# Altium footprint library Maxwell_LIB.PcbLib: 143 footprints (part 4 of 9)
Each footprint in its own frame and in the unit in brackets; x right, y up, seen from the top. Pads: shape width x height; smd on the part's side, far side on the other; paste and mask are expansions set on the pad; w line width, h text height; cw(c..) or ccw(c..) is an arc to the next point about the centre after c.
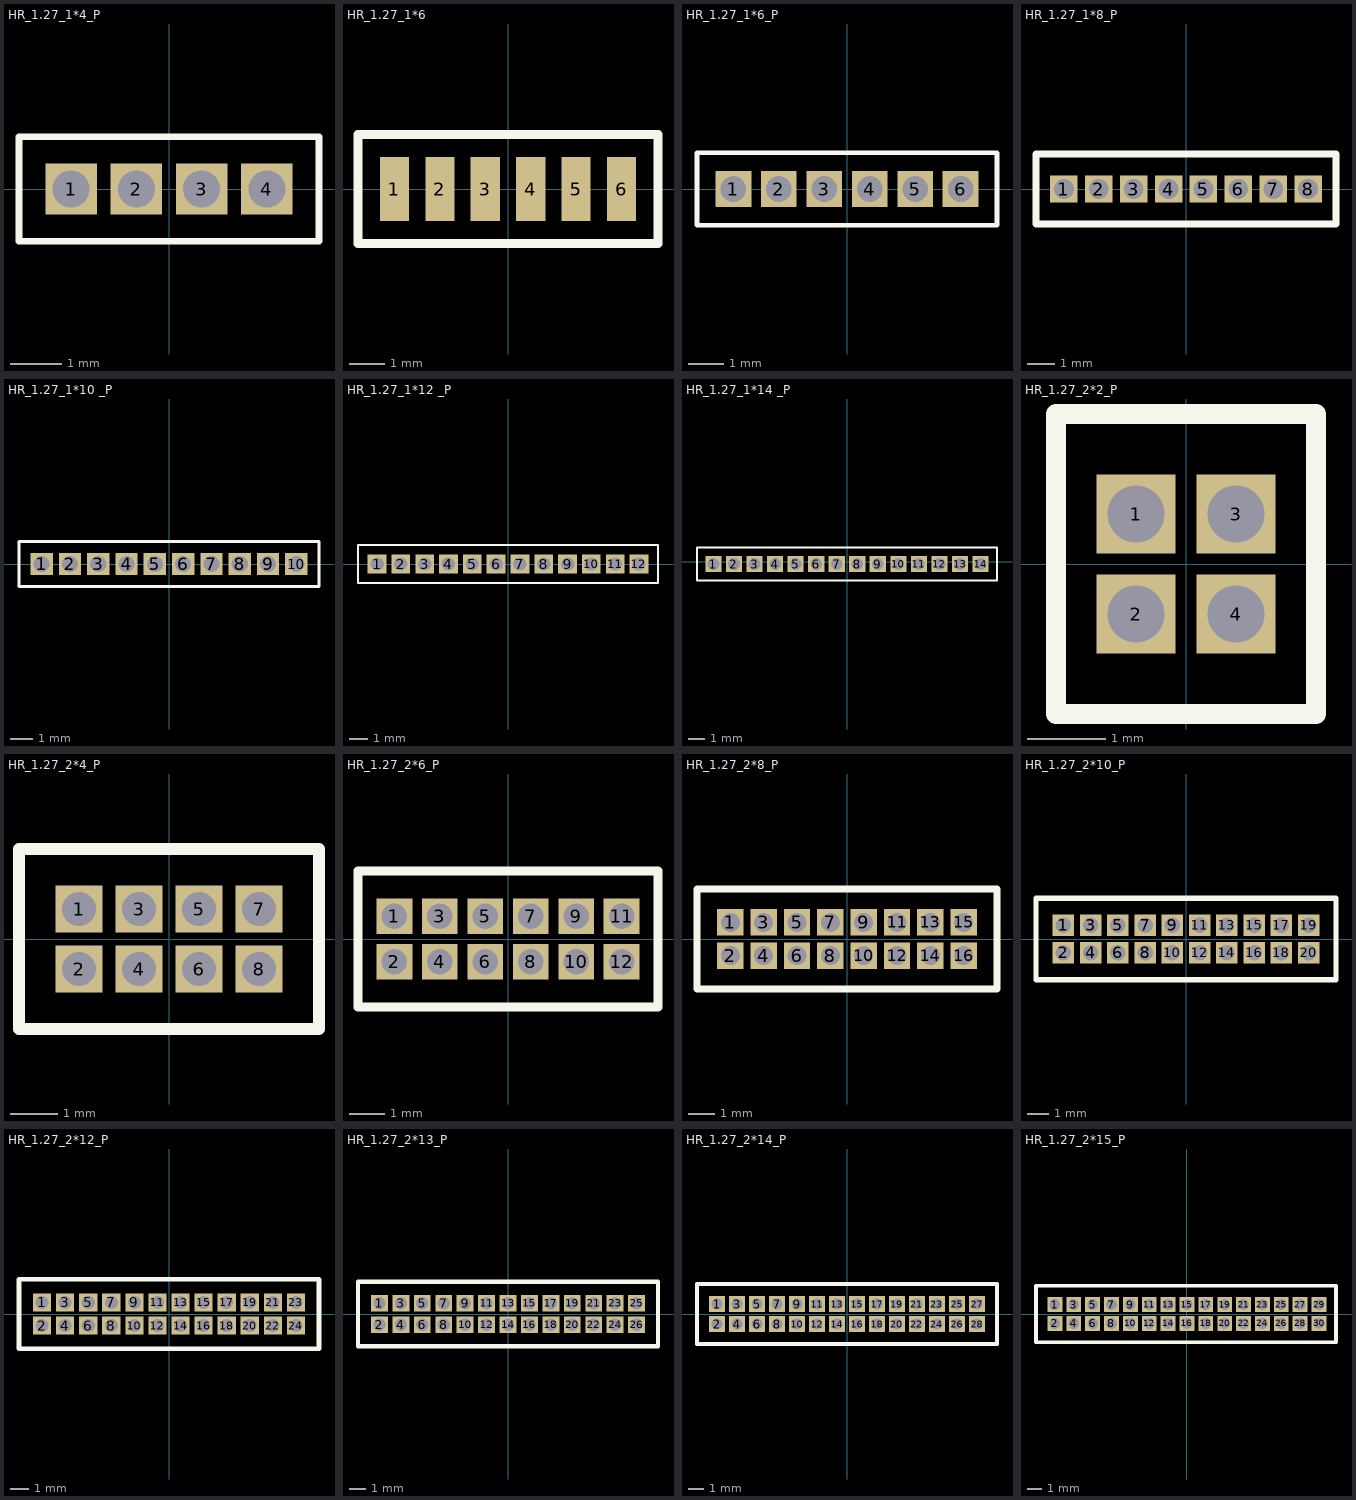
[diagram p3: the footprints below, top view; thin cyan lines are the x and y axes]

## HR_1.27_1*4_P [mm]
pads (4):
  rect 1x1 hole 0.72: 1(-1.905,0) 2(-0.635,0) 3(0.635,0) 4(1.905,0)
Top Overlay:
  lines w0.127: -2.921,-1.016 -2.921,1.016 2.921,1.016 2.921,-1.016 -2.921,-1.016

## HR_1.27_1*6 [mil]
pads (6):
  rect 32x70 smd: 1(-125,0) 2(-75,0) 3(-25,0) 4(25,0) 5(75,0) 6(125,0)
Top Overlay:
  lines w10: -165,-60 -165,60 165,60 165,-60 -165,-60

## HR_1.27_1*6_P [mm]
pads (6):
  rect 1x1 hole 0.72: 1(-3.175,0) 2(-1.905,0) 3(-0.635,0) 4(0.635,0) 5(1.905,0) 6(3.175,0)
Top Overlay:
  lines w0.127: -4.191,-1.016 1.651,-1.016 4.191,-1.016 4.191,1.016 1.651,1.016 -4.191,1.016 -4.191,-1.016

## HR_1.27_1*8_P [mm]
pads (8):
  rect 1x1 hole 0.72: 1(-4.445,0) 2(-3.175,0) 3(-1.905,0) 4(-0.635,0) 5(0.635,0) 6(1.905,0) 7(3.175,0) 8(4.445,0)
Top Overlay:
  lines w0.254: -5.461,-1.27 5.461,-1.27 5.461,1.27 -5.461,1.27 -5.461,-1.27

## HR_1.27_1*10 _P [mm]
pads (10):
  rect 1x1 hole 0.72: 1(-5.715,0) 2(-4.445,0) 3(-3.175,0) 4(-1.905,0) 5(-0.635,0) 6(0.635,0) 7(1.905,0) 8(3.175,0) 9(4.445,0) 10(5.715,0)
Top Overlay:
  lines w0.127: -6.731,-1.016 -0.889,-1.016 6.731,-1.016 6.731,1.016 -0.889,1.016 -6.731,1.016 -6.731,-1.016

## HR_1.27_1*12 _P [mm]
pads (12):
  rect 1x1 hole 0.72: 1(-6.985,0) 2(-5.715,0) 3(-4.445,0) 4(-3.175,0) 5(-1.905,0) 6(-0.635,0) 7(0.635,0) 8(1.905,0) 9(3.175,0) 10(4.445,0) 11(5.715,0) 12(6.985,0)
Top Overlay:
  lines w0.127: -8.001,-1.016 -8.001,1.016 -2.159,1.016 8.001,1.016 8.001,-1.016 -2.159,-1.016 -8.001,-1.016

## HR_1.27_1*14 _P [mm]
pads (14):
  rect 1x1 hole 0.72: 1(-8.255,-0.127) 2(-6.985,-0.127) 3(-5.715,-0.127) 4(-4.445,-0.127) 5(-3.175,-0.127) 6(-1.905,-0.127) 7(-0.635,-0.127) 8(0.635,-0.127) 9(1.905,-0.127) 10(3.175,-0.127) 11(4.445,-0.127) 12(5.715,-0.127) 13(6.985,-0.127) 14(8.255,-0.127)
Top Overlay:
  lines w0.127: -9.271,-1.143 -3.429,-1.143 9.271,-1.143 9.271,0.889 -3.429,0.889 -9.271,0.889 -9.271,-1.143

## HR_1.27_2*2_P [mm]
pads (4):
  rect 1x1 hole 0.72: 1(-0.635,0.635) 2(-0.635,-0.635) 3(0.635,0.635) 4(0.635,-0.635)
Top Overlay:
  lines w0.254: -1.651,-1.905 -1.651,1.905 1.651,1.905 1.651,-1.905 -1.651,-1.905
3D body "1.27-2x2.stp": height 5.5, standoff -2.35, extent -1.27,-1.7 1.27,1.7

## HR_1.27_2*4_P [mm]
pads (8):
  rect 1x1 hole 0.72: 1(-1.905,0.635) 2(-1.905,-0.635) 3(-0.635,0.635) 4(-0.635,-0.635) 5(0.635,0.635) 6(0.635,-0.635) 7(1.905,0.635) 8(1.905,-0.635)
Top Overlay:
  lines w0.254: -3.175,-1.905 3.175,-1.905 3.175,1.905 -3.175,1.905 -3.175,-1.905
3D body "1.27-2x4.stp": height 5.5, standoff -2.35, extent -2.54,-1.7 2.54,1.7

## HR_1.27_2*6_P [mm]
pads (12):
  rect 1x1 hole 0.72: 1(-3.175,0.635) 2(-3.175,-0.635) 3(-1.905,0.635) 4(-1.905,-0.635) 5(-0.635,0.635) 6(-0.635,-0.635) 7(0.635,0.635) 8(0.635,-0.635) 9(1.905,0.635) 10(1.905,-0.635) 11(3.175,0.635) 12(3.175,-0.635)
Top Overlay:
  lines w0.254: -4.191,-1.905 -4.191,1.905 4.191,1.905 4.191,-1.905 -4.191,-1.905
3D body "1.27-2x6.stp": height 5.5, standoff -2.35, extent -3.81,-1.7 3.81,1.7

## HR_1.27_2*8_P [mm]
pads (16):
  rect 1x1 hole 0.72: 1(-4.445,0.635) 2(-4.445,-0.635) 3(-3.175,0.635) 4(-3.175,-0.635) 5(-1.905,0.635) 6(-1.905,-0.635) 7(-0.635,0.635) 8(-0.635,-0.635) 9(0.635,0.635) 10(0.635,-0.635) 11(1.905,0.635) 12(1.905,-0.635) 13(3.175,0.635) 14(3.175,-0.635) 15(4.445,0.635) 16(4.445,-0.635)
Top Overlay:
  lines w0.254: -5.715,-1.905 -5.715,1.905 5.715,1.905 5.715,-1.905 -5.715,-1.905
3D body "1.27-2x8.stp": height 5.5, standoff -2.35, extent -5.08,-1.7 5.08,1.7

## HR_1.27_2*10_P [mm]
pads (20):
  rect 1x1 hole 0.72: 1(-5.715,0.635) 2(-5.715,-0.635) 3(-4.445,0.635) 4(-4.445,-0.635) 5(-3.175,0.635) 6(-3.175,-0.635) 7(-1.905,0.635) 8(-1.905,-0.635) 9(-0.635,0.635) 10(-0.635,-0.635) 11(0.635,0.635) 12(0.635,-0.635) 13(1.905,0.635) 14(1.905,-0.635) 15(3.175,0.635) 16(3.175,-0.635) 17(4.445,0.635) 18(4.445,-0.635) 19(5.715,0.635) 20(5.715,-0.635)
Top Overlay:
  lines w0.254: -6.985,-1.905 -6.985,1.905 6.985,1.905 6.985,-1.905 -6.985,-1.905
3D body "1.27-2x10.stp": height 5.5, standoff -2.35, extent -6.35,-1.7 6.35,1.7

## HR_1.27_2*12_P [mm]
pads (24):
  rect 1x1 hole 0.72: 1(-6.985,0.635) 2(-6.985,-0.635) 3(-5.715,0.635) 4(-5.715,-0.635) 5(-4.445,0.635) 6(-4.445,-0.635) 7(-3.175,0.635) 8(-3.175,-0.635) 9(-1.905,0.635) 10(-1.905,-0.635) 11(-0.635,0.635) 12(-0.635,-0.635) 13(0.635,0.635) 14(0.635,-0.635) 15(1.905,0.635) 16(1.905,-0.635) 17(3.175,0.635) 18(3.175,-0.635) 19(4.445,0.635) 20(4.445,-0.635) 21(5.715,0.635) 22(5.715,-0.635) 23(6.985,0.635) 24(6.985,-0.635)
Top Overlay:
  lines w0.254: -8.255,-1.905 5.715,-1.905 8.255,-1.905 8.255,1.905 5.715,1.905 -8.255,1.905 -8.255,-1.905
3D body "1.27-2x12.stp": height 5.5, standoff -2.35, extent -7.62,-1.7 7.62,1.7

## HR_1.27_2*13_P [mm]
pads (26):
  rect 1x1 hole 0.72: 1(-7.62,0.635) 2(-7.62,-0.635) 3(-6.35,0.635) 4(-6.35,-0.635) 5(-5.08,0.635) 6(-5.08,-0.635) 7(-3.81,0.635) 8(-3.81,-0.635) 9(-2.54,0.635) 10(-2.54,-0.635) 11(-1.27,0.635) 12(-1.27,-0.635) 13(0,0.635) 14(0,-0.635) 15(1.27,0.635) 16(1.27,-0.635) 17(2.54,0.635) 18(2.54,-0.635) 19(3.81,0.635) 20(3.81,-0.635) 21(5.08,0.635) 22(5.08,-0.635) 23(6.35,0.635) 24(6.35,-0.635) 25(7.62,0.635) 26(7.62,-0.635)
Top Overlay:
  lines w0.254: -8.89,-1.905 -8.89,1.905 5.08,1.905 8.89,1.905 8.89,-1.905 5.08,-1.905 -8.89,-1.905
3D body "1.27-2x13.stp": height 5.5, standoff -2.35, extent -8.255,-1.7 8.255,1.7

## HR_1.27_2*14_P [mm]
pads (28):
  rect 1x1 hole 0.72: 1(-8.255,0.635) 2(-8.255,-0.635) 3(-6.985,0.635) 4(-6.985,-0.635) 5(-5.715,0.635) 6(-5.715,-0.635) 7(-4.445,0.635) 8(-4.445,-0.635) 9(-3.175,0.635) 10(-3.175,-0.635) 11(-1.905,0.635) 12(-1.905,-0.635) 13(-0.635,0.635) 14(-0.635,-0.635) 15(0.635,0.635) 16(0.635,-0.635) 17(1.905,0.635) 18(1.905,-0.635) 19(3.175,0.635) 20(3.175,-0.635) 21(4.445,0.635) 22(4.445,-0.635) 23(5.715,0.635) 24(5.715,-0.635) 25(6.985,0.635) 26(6.985,-0.635) 27(8.255,0.635) 28(8.255,-0.635)
Top Overlay:
  lines w0.254: -9.525,-1.905 -9.525,1.905 4.445,1.905 9.525,1.905 9.525,-1.905 4.445,-1.905 -9.525,-1.905
3D body "1.27-2x14.stp": height 5.5, standoff -2.35, extent -8.89,-1.7 8.89,1.7

## HR_1.27_2*15_P [mm]
pads (30):
  rect 1x1 hole 0.72: 1(-8.89,0.635) 2(-8.89,-0.635) 3(-7.62,0.635) 4(-7.62,-0.635) 5(-6.35,0.635) 6(-6.35,-0.635) 7(-5.08,0.635) 8(-5.08,-0.635) 9(-3.81,0.635) 10(-3.81,-0.635) 11(-2.54,0.635) 12(-2.54,-0.635) 13(-1.27,0.635) 14(-1.27,-0.635) 15(0,0.635) 16(0,-0.635) 17(1.27,0.635) 18(1.27,-0.635) 19(2.54,0.635) 20(2.54,-0.635) 21(3.81,0.635) 22(3.81,-0.635) 23(5.08,0.635) 24(5.08,-0.635) 25(6.35,0.635) 26(6.35,-0.635) 27(7.62,0.635) 28(7.62,-0.635) 29(8.89,0.635) 30(8.89,-0.635)
Top Overlay:
  lines w0.254: -10.16,-1.905 -10.16,1.905 3.81,1.905 10.033,1.905 10.033,-1.905 3.81,-1.905 -10.16,-1.905
3D body "1.27-2x15.stp": height 5.5, standoff -2.35, extent -9.525,-1.7 9.525,1.7